# Altium footprint library 430 integreted.PcbLib: 281 footprints (part 2 of 18)
Each footprint in its own frame and in the unit in brackets; x right, y up, seen from the top. Pads: shape width x height; smd on the part's side, far side on the other; paste and mask are expansions set on the pad; w line width, h text height; cw(c..) or ccw(c..) is an arc to the next point about the centre after c.
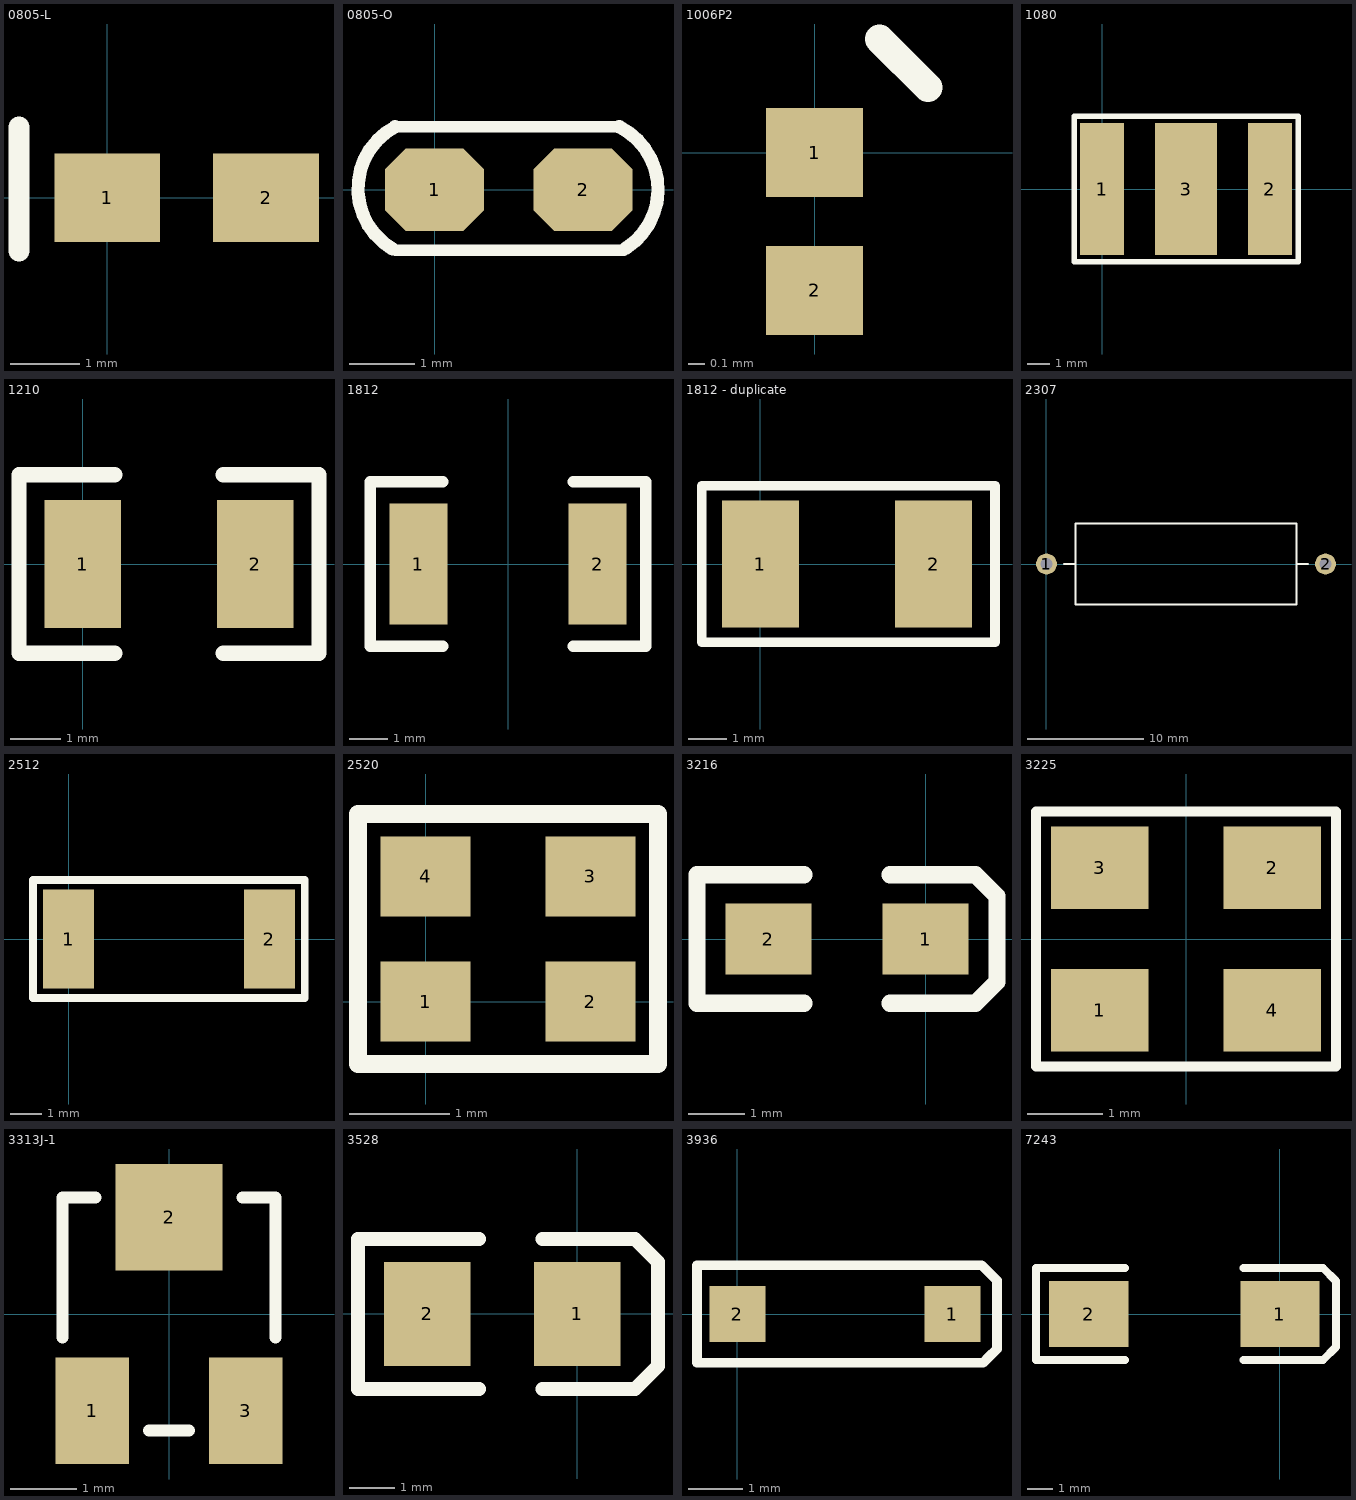
[diagram p1: the footprints below, top view; thin cyan lines are the x and y axes]

## 0805-L [mil]
pads (2):
  rect 60x50 smd: 1(0,0) 2(90,0)
Top Overlay:
  lines w12: -50,-30 -50,40

## 0805-O [mil]
pads (2):
  oct 60x50 smd: 1(0,0) 2(90,0)
Top Overlay:
  lines w7: -24,38 111.39,38 ; -23.42,-36.75 114.79,-36.75
  lines w8: -25.51,-36 cw(c-4.01,0.58) -24,38 ; 112,38 cw(c93.03,0.05) 115.79,-35.75

## 1006P2 [mm]
pads (2):
  rect 0.6x0.55 smd: 1(0,0) 2(0,-0.85)
Top Overlay:
  lines w0.178: 0.4,0.7 0.7,0.4

## 1080 [mm]
pads (3):
  rect 2x6 smd: 1(0,0) 2(7.6,0)
  rect 2.8x6 smd: 3(3.8,0)
Top Overlay:
  lines w0.254: -1.27,-3.302 -1.27,3.302 8.89,3.302 8.89,-3.302 -1.27,-3.302

## 1210 [mil]
pads (2):
  rect 60x100 smd: 1(0,0) 2(135,0)
Top Overlay:
  lines w12: 25,-70 -50,-70 -50,70 25,70 ; 110,-70 185,-70 185,70 110,70

## 1812 [mil]
pads (2):
  rect 60x125 smd: 1(-92.5,0) 2(92.5,0)
Top Overlay:
  lines w12: -67.5,-85 -142.5,-85 -142.5,85 -67.5,85 ; 67.5,-85 142.5,-85 142.5,85 67.5,85
3D body: height 51.97, standoff 0, extent -93.88,-63.38 95.88,63.39

## 1812 - duplicate [mm]
pads (2):
  rect 2x3.3 smd: 1(0,0) 2(4.5,0)
Top Overlay:
  lines w0.254: -1.524,-2.032 6.096,-2.032 6.096,-1.27 6.096,0.762 6.096,2.032 -1.524,2.032 -1.524,-2.032

## 2307 [mm]
pads (2):
  round 1.8 hole 1: 1(0,0) 2(24,0)
Top Overlay:
  lines w0.178: 1.5,0 2.5,0 ; 21.5,0 22.5,0 ; 2.5,-3.5 2.5,3.5 3,3.5 21.5,3.5 21.5,-3.5 2.5,-3.5

## 2512 [mm]
pads (2):
  rect 1.65x3.2 smd: 1(0,0) 2(6.48,0)
Top Overlay:
  lines w0.254: -1.143,-1.905 7.62,-1.905 7.62,1.905 -1.143,1.905 -1.143,-1.905

## 2520 [mm]
pads (4):
  rect 0.9x0.8 smd: 1(0,0) 2(1.65,0) 3(1.65,1.25) 4(0,1.25)
Top Overlay:
  lines w0.178: -0.675,-0.625 -0.675,1.875 2.325,1.875 2.325,-0.625 -0.675,-0.625

## 3216 [mil]
pads (2):
  rect 60x50 smd: 1(0,0) 2(-110,0)
Top Overlay:
  lines w12: -85,-45 -160,-45 -160,45 -85,45 ; -25,-45 35,-45 50,-30 50,30 35,45 -25,45

## 3225 [mm]
pads (4):
  rect 1.3x1.1 smd: 1(-1.15,-0.95) 2(1.15,0.95) 3(-1.15,0.95) 4(1.15,-0.95)
Top Overlay:
  lines w0.127: -2,-1.7 2,-1.7 2,1.7 -2,1.7 -2,-1.7
3D body: height 0.8, standoff 0, extent -1.6,-1.294 1.6,1.206

## 3313J-1 [mm]
pads (3):
  rect 1.1x1.6 smd: 1(-1.15,-1.45) 3(1.15,-1.45)
  rect 1.6x1.6 smd: 2(0,1.45)
Top Overlay:
  lines w0.178: -1.6,-0.35 -1.6,1.75 -1.1,1.75 ; -0.3,-1.75 0.3,-1.75 ; 1.1,1.75 1.6,1.75 1.6,-0.35

## 3528 [mil]
pads (2):
  rect 75x90 smd: 1(0,0) 2(-130,0)
Top Overlay:
  lines w12: -85,-65 -190,-65 -190,65 -85,65 ; -30,-65 50,-65 70,-45 70,45 50,65 -30,65

## 3936 [mil]
pads (2):
  rect 40x40 smd: 1(154,0) 2(0,0)
Top Overlay:
  lines w7: -29,-35 176,-35 180,-31 186,-25 186,24 175,35 -29,35 -29,-19 -29,-34 -29,-35

## 7243 [mil]
pads (2):
  rect 120x100 smd: 1(0,0) 2(-290,0)
Top Overlay:
  lines w12: -235,-70 -370,-70 -370,70 -235,70 ; -55,-70 65,-70 85,-50 85,50 65,70 -55,70